# Altium footprint library Audio-Beamformer.PcbLib: 47 footprints (part 1 of 3)
Each footprint in its own frame and in the unit in brackets; x right, y up, seen from the top. Pads: shape width x height; smd on the part's side, far side on the other; paste and mask are expansions set on the pad; w line width, h text height; cw(c..) or ccw(c..) is an arc to the next point about the centre after c.
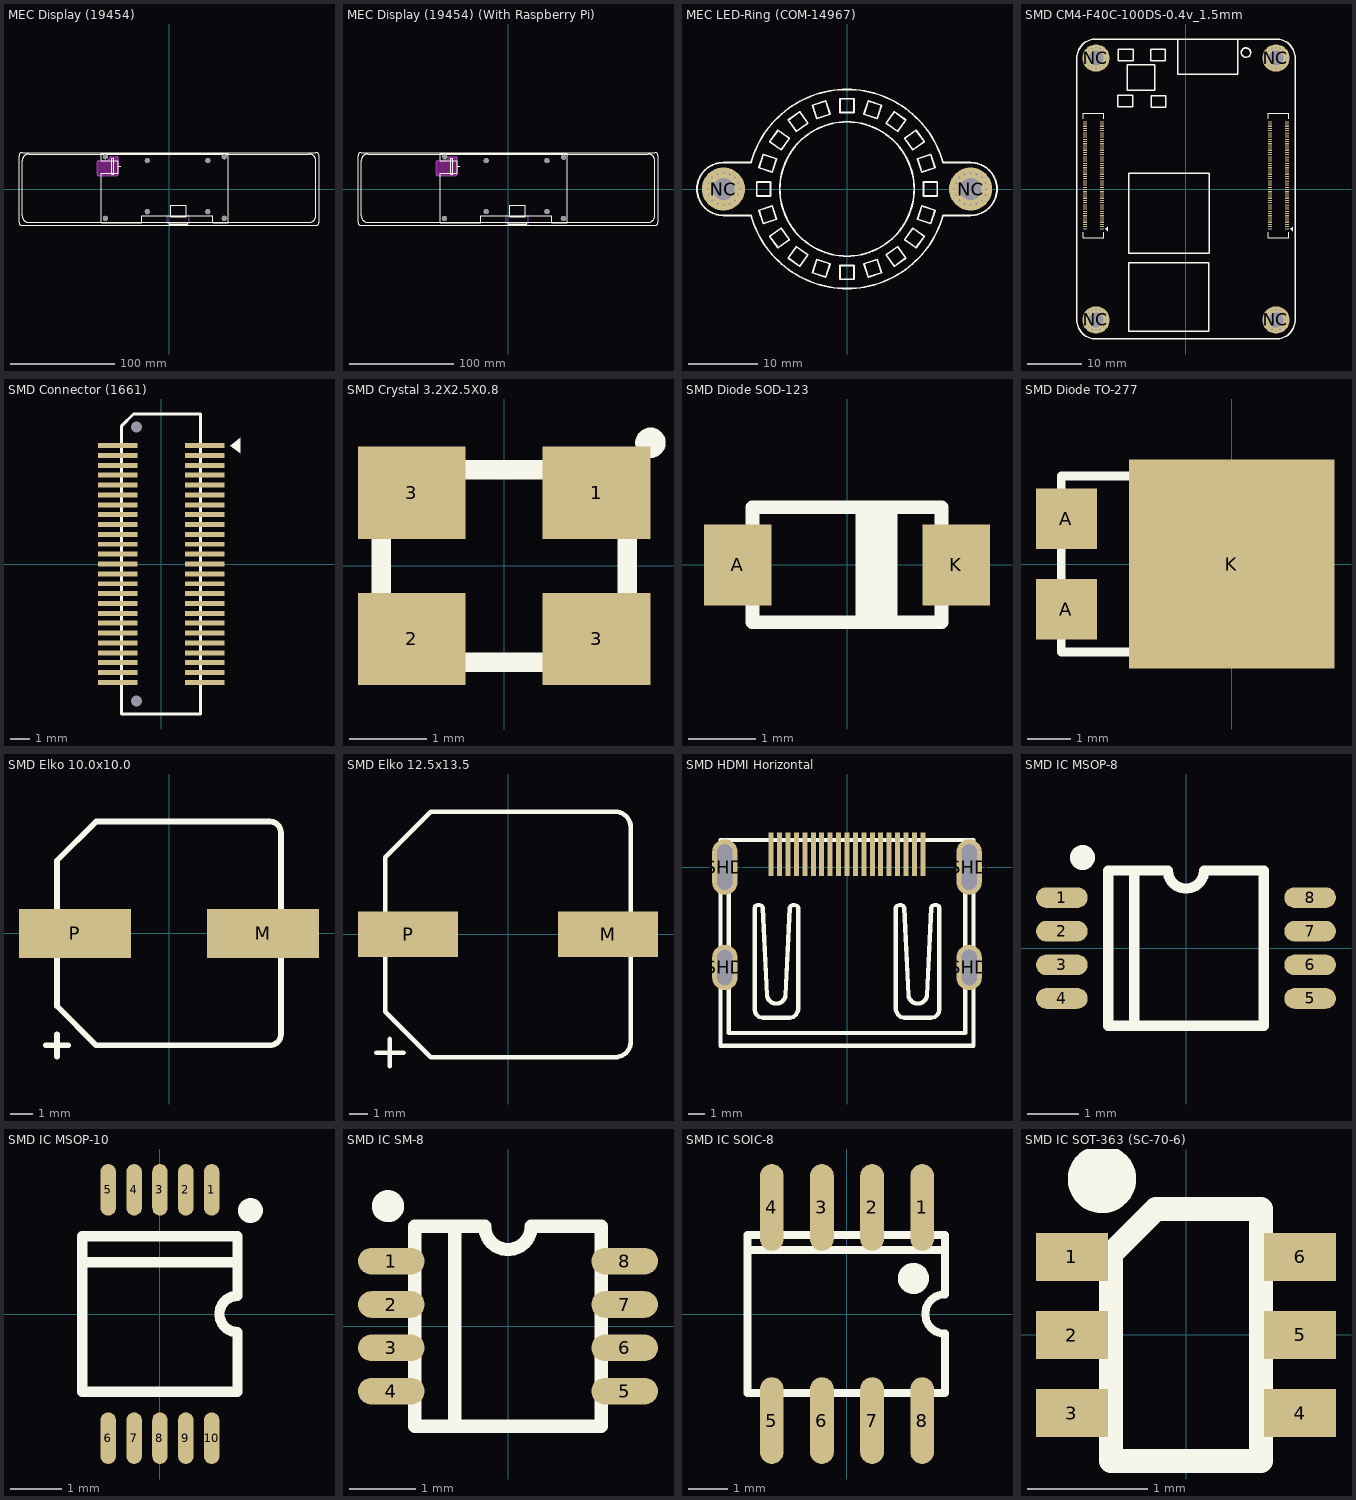
[diagram p0: the footprints below, top view; thin cyan lines are the x and y axes]

## MEC Display (19454) [mm] "Capacitor, Electrolytic, Radial; Body 5 x 5 mm (Dia.xH typ); Pin Spacing 2 mm (typ)"
height 6
pads (8):
  round 5 hole 2.7: NC(-61,-28.1) NC(-61,30.9) NC(-20.8,-21.725) NC(-20.8,27.275) NC(37.2,-21.725) NC(37.2,27.275) NC(53,-28.1) NC(53,30.9)
via 54.344,29.556 diameter 0.62 hole 0.3
via 53,29 diameter 0.62 hole 0.3
via 53.727,29.145 diameter 0.62 hole 0.3
via 54.755,30.173 diameter 0.62 hole 0.3
via 54.344,32.243 diameter 0.62 hole 0.3
via 54.9,30.9 diameter 0.62 hole 0.3
via 54.755,31.627 diameter 0.62 hole 0.3
via 53.727,32.655 diameter 0.62 hole 0.3
via 51.657,29.556 diameter 0.62 hole 0.3
via 51.1,30.9 diameter 0.62 hole 0.3
via 51.245,30.173 diameter 0.62 hole 0.3
via 52.273,29.145 diameter 0.62 hole 0.3
via 51.245,31.627 diameter 0.62 hole 0.3
via 52.273,32.655 diameter 0.62 hole 0.3
via 53,32.8 diameter 0.62 hole 0.3
via 51.656,32.243 diameter 0.62 hole 0.3
via -59.656,29.556 diameter 0.62 hole 0.3
via -61,29 diameter 0.62 hole 0.3
via -60.273,29.145 diameter 0.62 hole 0.3
via -59.245,30.173 diameter 0.62 hole 0.3
via -59.656,32.243 diameter 0.62 hole 0.3
via -59.1,30.9 diameter 0.62 hole 0.3
via -59.245,31.627 diameter 0.62 hole 0.3
via -60.273,32.655 diameter 0.62 hole 0.3
via -62.343,29.556 diameter 0.62 hole 0.3
via -62.9,30.9 diameter 0.62 hole 0.3
via -62.755,30.173 diameter 0.62 hole 0.3
via -61.727,29.145 diameter 0.62 hole 0.3
via -62.755,31.627 diameter 0.62 hole 0.3
via -61.727,32.655 diameter 0.62 hole 0.3
via -61,32.8 diameter 0.62 hole 0.3
via -62.344,32.243 diameter 0.62 hole 0.3
via 54.344,-29.444 diameter 0.62 hole 0.3
via 53,-30 diameter 0.62 hole 0.3
via 53.727,-29.855 diameter 0.62 hole 0.3
via 54.755,-28.827 diameter 0.62 hole 0.3
via 54.344,-26.757 diameter 0.62 hole 0.3
via 54.9,-28.1 diameter 0.62 hole 0.3
via 54.755,-27.373 diameter 0.62 hole 0.3
via 53.727,-26.345 diameter 0.62 hole 0.3
via 51.657,-29.444 diameter 0.62 hole 0.3
via 51.1,-28.1 diameter 0.62 hole 0.3
via 51.245,-28.827 diameter 0.62 hole 0.3
via 52.273,-29.855 diameter 0.62 hole 0.3
via 51.245,-27.373 diameter 0.62 hole 0.3
via 52.273,-26.345 diameter 0.62 hole 0.3
via 53,-26.2 diameter 0.62 hole 0.3
via 51.656,-26.757 diameter 0.62 hole 0.3
via -59.656,-29.444 diameter 0.62 hole 0.3
via -61,-30 diameter 0.62 hole 0.3
via -60.273,-29.855 diameter 0.62 hole 0.3
via -59.245,-28.827 diameter 0.62 hole 0.3
via -59.656,-26.757 diameter 0.62 hole 0.3
via -59.1,-28.1 diameter 0.62 hole 0.3
via -59.245,-27.373 diameter 0.62 hole 0.3
via -60.273,-26.345 diameter 0.62 hole 0.3
via -62.343,-29.444 diameter 0.62 hole 0.3
via -62.9,-28.1 diameter 0.62 hole 0.3
via -62.755,-28.827 diameter 0.62 hole 0.3
via -61.727,-29.855 diameter 0.62 hole 0.3
via -62.755,-27.373 diameter 0.62 hole 0.3
via -61.727,-26.345 diameter 0.62 hole 0.3
via -61,-26.2 diameter 0.62 hole 0.3
via -62.344,-26.757 diameter 0.62 hole 0.3
via -19.456,25.931 diameter 0.62 hole 0.3
via -20.8,25.375 diameter 0.62 hole 0.3
via -20.073,25.52 diameter 0.62 hole 0.3
via -19.045,26.548 diameter 0.62 hole 0.3
via -19.456,28.618 diameter 0.62 hole 0.3
via -18.9,27.275 diameter 0.62 hole 0.3
via -19.045,28.002 diameter 0.62 hole 0.3
via -20.073,29.03 diameter 0.62 hole 0.3
via -22.143,25.931 diameter 0.62 hole 0.3
via -22.7,27.275 diameter 0.62 hole 0.3
via -22.555,26.548 diameter 0.62 hole 0.3
via -21.527,25.52 diameter 0.62 hole 0.3
via -22.555,28.002 diameter 0.62 hole 0.3
via -21.527,29.03 diameter 0.62 hole 0.3
via -20.8,29.175 diameter 0.62 hole 0.3
via -22.144,28.619 diameter 0.62 hole 0.3
via 38.544,25.931 diameter 0.62 hole 0.3
via 37.2,25.375 diameter 0.62 hole 0.3
via 37.927,25.52 diameter 0.62 hole 0.3
via 38.955,26.548 diameter 0.62 hole 0.3
via 38.543,28.618 diameter 0.62 hole 0.3
via 39.1,27.275 diameter 0.62 hole 0.3
via 38.955,28.002 diameter 0.62 hole 0.3
via 37.927,29.03 diameter 0.62 hole 0.3
via 35.856,25.931 diameter 0.62 hole 0.3
via 35.3,27.275 diameter 0.62 hole 0.3
via 35.445,26.548 diameter 0.62 hole 0.3
via 36.473,25.52 diameter 0.62 hole 0.3
via 35.445,28.002 diameter 0.62 hole 0.3
via 36.473,29.03 diameter 0.62 hole 0.3
via 37.2,29.175 diameter 0.62 hole 0.3
via 35.856,28.619 diameter 0.62 hole 0.3
via 38.544,-23.069 diameter 0.62 hole 0.3
via 37.2,-23.625 diameter 0.62 hole 0.3
via 37.927,-23.48 diameter 0.62 hole 0.3
via 38.955,-22.452 diameter 0.62 hole 0.3
via 38.543,-20.382 diameter 0.62 hole 0.3
via 39.1,-21.725 diameter 0.62 hole 0.3
via 38.955,-20.998 diameter 0.62 hole 0.3
via 37.927,-19.97 diameter 0.62 hole 0.3
via 35.856,-23.069 diameter 0.62 hole 0.3
via 35.3,-21.725 diameter 0.62 hole 0.3
via 35.445,-22.452 diameter 0.62 hole 0.3
via 36.473,-23.48 diameter 0.62 hole 0.3
via 35.445,-20.998 diameter 0.62 hole 0.3
via 36.473,-19.97 diameter 0.62 hole 0.3
via 37.2,-19.825 diameter 0.62 hole 0.3
via 35.856,-20.382 diameter 0.62 hole 0.3
via -19.456,-23.069 diameter 0.62 hole 0.3
via -20.8,-23.625 diameter 0.62 hole 0.3
via -20.073,-23.48 diameter 0.62 hole 0.3
via -19.045,-22.452 diameter 0.62 hole 0.3
via -19.456,-20.382 diameter 0.62 hole 0.3
via -18.9,-21.725 diameter 0.62 hole 0.3
via -19.045,-20.998 diameter 0.62 hole 0.3
via -20.073,-19.97 diameter 0.62 hole 0.3
via -22.143,-23.069 diameter 0.62 hole 0.3
via -22.7,-21.725 diameter 0.62 hole 0.3
via -22.555,-22.452 diameter 0.62 hole 0.3
via -21.527,-23.48 diameter 0.62 hole 0.3
via -22.555,-20.998 diameter 0.62 hole 0.3
via -21.527,-19.97 diameter 0.62 hole 0.3
via -20.8,-19.825 diameter 0.62 hole 0.3
via -22.144,-20.382 diameter 0.62 hole 0.3
Top Overlay:
  circle w0.254: c53,30.9 r1.35
  circle w0.254: c-61,30.9 r1.35
  circle w0.254: c53,-28.1 r1.35
  circle w0.254: c-61,-28.1 r1.35
  circle w0.254: c37.2,-21.725 r1.35
  circle w0.254: c37.2,27.275 r1.35
  circle w0.254: c-20.8,27.275 r1.35
  circle w0.254: c-20.8,-21.725 r1.35
  lines w0.254: -48.8,21.85 -46.35,21.85 ; -143.75,-31.9 ccw(c-140.75,-31.9) -140.75,-34.9 140.75,-34.9 ccw(c140.75,-31.9) 143.75,-31.9 143.75,31.9 ccw(c140.75,31.9) 140.75,34.9 -140.75,34.9 ccw(c-140.75,31.9) -143.75,31.9 -143.75,-31.9 ; -140.6,-25.8 ccw(c-134.4,-25.8) -134.4,-32 134.4,-32 ccw(c134.4,-25.8) 140.6,-25.8 140.6,27.3 ccw(c134.4,27.3) 134.4,33.5 -134.4,33.5 ccw(c-134.4,27.3) -140.6,27.3 -140.6,-25.8 ; -65,-32.5 -26,-32.5 -26,-25.5 41.7,-25.5 41.7,-32.5 57,-32.5 57,34 -65,34 -65,27.1 -48.8,27.1 -48.8,14.9 -65,14.9 -65,-32.5 ; -54.7,14.35 -54.7,29.35 -53.1,29.35 -53.1,14.35 -54.7,14.35 ; 0,-33.9 0,-32.3 18,-32.3 18,-33.9 0,-33.9 ; 1.5,-26.6 1.5,-15.66 16.5,-15.66 16.5,-26.6 1.5,-26.6
Keep-Out Layer:
  board cut-out: -49.8,30.8 -49.702,30.8 -49.508,30.762 -49.326,30.686 -49.163,30.577 -49.023,30.437 -48.914,30.274 -48.838,30.092 -48.8,29.898 -48.8,29.8 -48.8,13.9 -48.8,13.802 -48.838,13.608 -48.914,13.426 -49.023,13.263 -49.163,13.123 -49.326,13.014 -49.508,12.938 -49.702,12.9 -49.8,12.9 -67.8,12.9 -67.898,12.9 -68.092,12.938 -68.274,13.014 -68.437,13.123 -68.577,13.263 -68.686,13.426 -68.762,13.608 -68.8,13.802 -68.8,13.9 -68.8,26.1 -68.8,26.198 -68.762,26.392 -68.686,26.574 -68.577,26.737 -68.437,26.877 -68.274,26.986 -68.092,27.062 -67.898,27.1 -67.8,27.1 -60.56,27.1 -60.384,27.104 -60.034,27.139 -59.689,27.207 -59.352,27.31 -59.027,27.444 -58.717,27.61 -58.424,27.805 -58.152,28.029 -58.025,28.15 -57.725,28.475 -57.525,28.75 -57.35,29.025 -57.225,29.275 -57.125,29.525 -57.05,29.725 -56.975,29.975 -56.9,30.225 -56.825,30.375 -56.725,30.5 -56.575,30.625 -56.5,30.675 -56.4,30.725 -56.275,30.775 -56.075,30.8 -49.825,30.8
Mechanical 1:
  lines w0.254: -1.5,-34 -1.5,-26.5 cw(c-0.5,-26.5) -0.5,-25.5 9,-25.5 18.5,-25.5 cw(c18.5,-26.5) 19.5,-26.5 19.5,-34 ; -68.8,13.9 ccw(c-67.8,13.9) -67.8,12.9 -49.8,12.9 ccw(c-49.8,13.9) -48.8,13.9 -48.8,21 -48.8,29.8 ccw(c-49.8,29.8) -49.8,30.8 -56.025,30.8 ccw(c-56.025,29.838) -56.946,30.116 -57.026,29.842 cw(c-60.6,30.8) -60.6,27.1 -67.8,27.1 ccw(c-67.8,26.1) -68.8,26.1 -68.8,21 -68.8,13.9
3D body "Adapter_HDMI.x_t": height 7.8, standoff -8.2, extent 0,-36.8 18,-19.8
3D body "Display (No Connectors).x_t": height 16.9, standoff 0, extent -143.75,-34.9 143.75,34.9
3D body "Adapter_USB.x_t": height 8.35, standoff -7.95, extent -55.1,14.35 -38.1,29.35

## MEC Display (19454) (With Raspberry Pi) [mm] "Capacitor, Electrolytic, Radial; Body 5 x 5 mm (Dia.xH typ); Pin Spacing 2 mm (typ)"
height 6
pads (8):
  round 5 hole 2.7: NC(-61,-28.2) NC(-60.6,30.8) NC(-20.9,-21.65) NC(-20.9,27.2) NC(37.3,-21.65) NC(37.3,27.2) NC(53,-28.2) NC(53.3,30.4)
via -59.256,29.456 diameter 0.62 hole 0.3
via -60.6,28.9 diameter 0.62 hole 0.3
via -59.873,29.045 diameter 0.62 hole 0.3
via -58.845,30.073 diameter 0.62 hole 0.3
via -59.257,32.143 diameter 0.62 hole 0.3
via -58.7,30.8 diameter 0.62 hole 0.3
via -58.845,31.527 diameter 0.62 hole 0.3
via -59.873,32.555 diameter 0.62 hole 0.3
via -61.944,29.456 diameter 0.62 hole 0.3
via -62.5,30.8 diameter 0.62 hole 0.3
via -62.355,30.073 diameter 0.62 hole 0.3
via -61.327,29.045 diameter 0.62 hole 0.3
via -62.355,31.527 diameter 0.62 hole 0.3
via -61.327,32.555 diameter 0.62 hole 0.3
via -60.6,32.7 diameter 0.62 hole 0.3
via -61.944,32.143 diameter 0.62 hole 0.3
via -19.556,25.856 diameter 0.62 hole 0.3
via -20.9,25.3 diameter 0.62 hole 0.3
via -20.173,25.445 diameter 0.62 hole 0.3
via -19.145,26.473 diameter 0.62 hole 0.3
via -19.556,28.543 diameter 0.62 hole 0.3
via -19,27.2 diameter 0.62 hole 0.3
via -19.145,27.927 diameter 0.62 hole 0.3
via -20.173,28.955 diameter 0.62 hole 0.3
via -22.243,25.856 diameter 0.62 hole 0.3
via -22.8,27.2 diameter 0.62 hole 0.3
via -22.655,26.473 diameter 0.62 hole 0.3
via -21.627,25.445 diameter 0.62 hole 0.3
via -22.655,27.927 diameter 0.62 hole 0.3
via -21.627,28.955 diameter 0.62 hole 0.3
via -20.9,29.1 diameter 0.62 hole 0.3
via -22.244,28.543 diameter 0.62 hole 0.3
via 38.644,25.856 diameter 0.62 hole 0.3
via 37.3,25.3 diameter 0.62 hole 0.3
via 38.027,25.445 diameter 0.62 hole 0.3
via 39.055,26.473 diameter 0.62 hole 0.3
via 38.643,28.543 diameter 0.62 hole 0.3
via 39.2,27.2 diameter 0.62 hole 0.3
via 39.055,27.927 diameter 0.62 hole 0.3
via 38.027,28.955 diameter 0.62 hole 0.3
via 35.956,25.856 diameter 0.62 hole 0.3
via 35.4,27.2 diameter 0.62 hole 0.3
via 35.545,26.473 diameter 0.62 hole 0.3
via 36.573,25.445 diameter 0.62 hole 0.3
via 35.545,27.927 diameter 0.62 hole 0.3
via 36.573,28.955 diameter 0.62 hole 0.3
via 37.3,29.1 diameter 0.62 hole 0.3
via 35.956,28.543 diameter 0.62 hole 0.3
via 54.644,29.056 diameter 0.62 hole 0.3
via 53.3,28.5 diameter 0.62 hole 0.3
via 54.027,28.645 diameter 0.62 hole 0.3
via 55.055,29.673 diameter 0.62 hole 0.3
via 54.644,31.743 diameter 0.62 hole 0.3
via 55.2,30.4 diameter 0.62 hole 0.3
via 55.055,31.127 diameter 0.62 hole 0.3
via 54.027,32.155 diameter 0.62 hole 0.3
via 51.957,29.056 diameter 0.62 hole 0.3
via 51.4,30.4 diameter 0.62 hole 0.3
via 51.545,29.673 diameter 0.62 hole 0.3
via 52.573,28.645 diameter 0.62 hole 0.3
via 51.545,31.127 diameter 0.62 hole 0.3
via 52.573,32.155 diameter 0.62 hole 0.3
via 53.3,32.3 diameter 0.62 hole 0.3
via 51.956,31.744 diameter 0.62 hole 0.3
via 54.344,-29.544 diameter 0.62 hole 0.3
via 53,-30.1 diameter 0.62 hole 0.3
via 53.727,-29.955 diameter 0.62 hole 0.3
via 54.755,-28.927 diameter 0.62 hole 0.3
via 54.344,-26.857 diameter 0.62 hole 0.3
via 54.9,-28.2 diameter 0.62 hole 0.3
via 54.755,-27.473 diameter 0.62 hole 0.3
via 53.727,-26.445 diameter 0.62 hole 0.3
via 51.657,-29.544 diameter 0.62 hole 0.3
via 51.1,-28.2 diameter 0.62 hole 0.3
via 51.245,-28.927 diameter 0.62 hole 0.3
via 52.273,-29.955 diameter 0.62 hole 0.3
via 51.245,-27.473 diameter 0.62 hole 0.3
via 52.273,-26.445 diameter 0.62 hole 0.3
via 53,-26.3 diameter 0.62 hole 0.3
via 51.656,-26.856 diameter 0.62 hole 0.3
via 38.644,-22.994 diameter 0.62 hole 0.3
via 37.3,-23.55 diameter 0.62 hole 0.3
via 38.027,-23.405 diameter 0.62 hole 0.3
via 39.055,-22.377 diameter 0.62 hole 0.3
via 38.643,-20.307 diameter 0.62 hole 0.3
via 39.2,-21.65 diameter 0.62 hole 0.3
via 39.055,-20.923 diameter 0.62 hole 0.3
via 38.027,-19.895 diameter 0.62 hole 0.3
via 35.956,-22.994 diameter 0.62 hole 0.3
via 35.4,-21.65 diameter 0.62 hole 0.3
via 35.545,-22.377 diameter 0.62 hole 0.3
via 36.573,-23.405 diameter 0.62 hole 0.3
via 35.545,-20.923 diameter 0.62 hole 0.3
via 36.573,-19.895 diameter 0.62 hole 0.3
via 37.3,-19.75 diameter 0.62 hole 0.3
via 35.956,-20.306 diameter 0.62 hole 0.3
via -19.556,-22.994 diameter 0.62 hole 0.3
via -20.9,-23.55 diameter 0.62 hole 0.3
via -20.173,-23.405 diameter 0.62 hole 0.3
via -19.145,-22.377 diameter 0.62 hole 0.3
via -19.556,-20.307 diameter 0.62 hole 0.3
via -19,-21.65 diameter 0.62 hole 0.3
via -19.145,-20.923 diameter 0.62 hole 0.3
via -20.173,-19.895 diameter 0.62 hole 0.3
via -22.243,-22.994 diameter 0.62 hole 0.3
via -22.8,-21.65 diameter 0.62 hole 0.3
via -22.655,-22.377 diameter 0.62 hole 0.3
via -21.627,-23.405 diameter 0.62 hole 0.3
via -22.655,-20.923 diameter 0.62 hole 0.3
via -21.627,-19.895 diameter 0.62 hole 0.3
via -20.9,-19.75 diameter 0.62 hole 0.3
via -22.244,-20.306 diameter 0.62 hole 0.3
via -59.656,-29.544 diameter 0.62 hole 0.3
via -61,-30.1 diameter 0.62 hole 0.3
via -60.273,-29.955 diameter 0.62 hole 0.3
via -59.245,-28.927 diameter 0.62 hole 0.3
via -59.656,-26.857 diameter 0.62 hole 0.3
via -59.1,-28.2 diameter 0.62 hole 0.3
via -59.245,-27.473 diameter 0.62 hole 0.3
via -60.273,-26.445 diameter 0.62 hole 0.3
via -62.343,-29.544 diameter 0.62 hole 0.3
via -62.9,-28.2 diameter 0.62 hole 0.3
via -62.755,-28.927 diameter 0.62 hole 0.3
via -61.727,-29.955 diameter 0.62 hole 0.3
via -62.755,-27.473 diameter 0.62 hole 0.3
via -61.727,-26.445 diameter 0.62 hole 0.3
via -61,-26.3 diameter 0.62 hole 0.3
via -62.344,-26.856 diameter 0.62 hole 0.3
Top Overlay:
  circle w0.254: c53,-28.2 r1.35
  circle w0.254: c37.3,-21.65 r1.35
  circle w0.254: c53.3,30.4 r1.35
  circle w0.254: c37.3,27.2 r1.35
  circle w0.254: c-20.9,27.2 r1.35
  circle w0.254: c-60.6,30.8 r1.35
  circle w0.254: c-20.9,-21.65 r1.35
  circle w0.254: c-61,-28.2 r1.35
  lines w0.254: -48.8,21.85 -46.35,21.85 ; -143.75,-31.9 ccw(c-140.75,-31.9) -140.75,-34.9 140.75,-34.9 ccw(c140.75,-31.9) 143.75,-31.9 143.75,31.9 ccw(c140.75,31.9) 140.75,34.9 -140.75,34.9 ccw(c-140.75,31.9) -143.75,31.9 -143.75,-31.9 ; -140.6,-25.8 ccw(c-134.4,-25.8) -134.4,-32 134.4,-32 ccw(c134.4,-25.8) 140.6,-25.8 140.6,27.3 ccw(c134.4,27.3) 134.4,33.5 -134.4,33.5 ccw(c-134.4,27.3) -140.6,27.3 -140.6,-25.8 ; -65,-32.5 -26,-32.5 -26,-25.5 41.7,-25.5 41.7,-32.5 57,-32.5 57,34 -65,34 -65,27.1 -48.8,27.1 -48.8,14.9 -65,14.9 -65,-32.5 ; -54.7,14.35 -54.7,29.35 -53.1,29.35 -53.1,14.35 -54.7,14.35 ; 0,-33.9 0,-32.3 18,-32.3 18,-33.9 0,-33.9 ; 1.5,-26.6 1.5,-15.66 16.5,-15.66 16.5,-26.6 1.5,-26.6
Keep-Out Layer:
  board cut-out: -49.8,30.8 -49.702,30.8 -49.508,30.762 -49.326,30.686 -49.163,30.577 -49.023,30.437 -48.914,30.274 -48.838,30.092 -48.8,29.898 -48.8,29.8 -48.8,13.9 -48.8,13.802 -48.838,13.608 -48.914,13.426 -49.023,13.263 -49.163,13.123 -49.326,13.014 -49.508,12.938 -49.702,12.9 -49.8,12.9 -67.8,12.9 -67.898,12.9 -68.092,12.938 -68.274,13.014 -68.437,13.123 -68.577,13.263 -68.686,13.426 -68.762,13.608 -68.8,13.802 -68.8,13.9 -68.8,26.1 -68.8,26.198 -68.762,26.392 -68.686,26.574 -68.577,26.737 -68.437,26.877 -68.274,26.986 -68.092,27.062 -67.898,27.1 -67.8,27.1 -60.56,27.1 -60.384,27.104 -60.034,27.139 -59.689,27.207 -59.352,27.31 -59.027,27.444 -58.717,27.61 -58.424,27.805 -58.152,28.029 -58.025,28.15 -57.725,28.475 -57.525,28.75 -57.35,29.025 -57.225,29.275 -57.125,29.525 -57.05,29.725 -56.975,29.975 -56.9,30.225 -56.825,30.375 -56.725,30.5 -56.575,30.625 -56.5,30.675 -56.4,30.725 -56.275,30.775 -56.075,30.8 -49.825,30.8
Mechanical 1:
  lines w0.254: -1.5,-34.9 -1.5,-25.5 9,-25.5 19.5,-25.5 19.5,-34.9 ; -68.8,13.9 ccw(c-67.8,13.9) -67.8,12.9 -49.8,12.9 ccw(c-49.8,13.9) -48.8,13.9 -48.8,21 -48.8,29.8 ccw(c-49.8,29.8) -49.8,30.8 -56.025,30.8 ccw(c-56.025,29.838) -56.946,30.116 -57.026,29.842 cw(c-60.6,30.8) -60.6,27.1 -67.8,27.1 ccw(c-67.8,26.1) -68.8,26.1 -68.8,21 -68.8,13.9
3D body "Adapter_HDMI.x_t": height 7.8, standoff -8.2, extent 0,-36.8 18,-19.8
3D body "raspberry_pi_3_b_plus.stp": height 2.12, standoff -17.9, extent -46.671,-27.658 40.6,30.8
3D body "Display (No Connectors).x_t": height 16.9, standoff 0, extent -143.75,-34.9 143.75,34.9
3D body "Adapter_USB.x_t": height 8.35, standoff -7.95, extent -55.1,14.35 -38.1,29.35
3D body "c-292303-1-e4-3d.x_t": height 8.84, standoff -2.52, extent -46.35,13.733 -32.35,29.967

## MEC LED-Ring (COM-14967) [mm] "Capacitor, Electrolytic, Radial; Body 5 x 5 mm (Dia.xH typ); Pin Spacing 2 mm (typ)"
height 6
pads (2):
  round 6.2 hole 3.2: NC(-17.78,0) NC(17.78,0)
via 19.406,1.626 diameter 0.62 hole 0.3
via 19.905,0.88 diameter 0.62 hole 0.3
via 18.66,2.125 diameter 0.62 hole 0.3
via 20.08,0 diameter 0.62 hole 0.3
via 17.78,2.3 diameter 0.62 hole 0.3
via 15.48,0 diameter 0.62 hole 0.3
via 16.154,1.626 diameter 0.62 hole 0.3
via 16.154,-1.626 diameter 0.62 hole 0.3
via 19.406,-1.626 diameter 0.62 hole 0.3
via 15.655,-0.88 diameter 0.62 hole 0.3
via 18.66,-2.125 diameter 0.62 hole 0.3
via 16.9,2.125 diameter 0.62 hole 0.3
via 16.9,-2.125 diameter 0.62 hole 0.3
via 15.655,0.88 diameter 0.62 hole 0.3
via 17.78,-2.3 diameter 0.62 hole 0.3
via 19.905,-0.88 diameter 0.62 hole 0.3
via -19.406,1.626 diameter 0.62 hole 0.3
via -19.905,0.88 diameter 0.62 hole 0.3
via -18.66,2.125 diameter 0.62 hole 0.3
via -20.08,0 diameter 0.62 hole 0.3
via -17.78,2.3 diameter 0.62 hole 0.3
via -15.48,0 diameter 0.62 hole 0.3
via -16.154,1.626 diameter 0.62 hole 0.3
via -16.154,-1.626 diameter 0.62 hole 0.3
via -19.406,-1.626 diameter 0.62 hole 0.3
via -15.655,-0.88 diameter 0.62 hole 0.3
via -18.66,-2.125 diameter 0.62 hole 0.3
via -16.9,2.125 diameter 0.62 hole 0.3
via -16.9,-2.125 diameter 0.62 hole 0.3
via -15.655,0.88 diameter 0.62 hole 0.3
via -17.78,-2.3 diameter 0.62 hole 0.3
via -19.905,-0.88 diameter 0.62 hole 0.3
Top Overlay:
  circle w0.254: c0,0 r9.66
  lines w0.254: -21.58,0 cw(c-17.78,0) -17.78,3.8 -13.807,3.8 cw(c0,0) 0,14.32 cw(c0,0) 13.807,3.799 17.78,3.8 cw(c17.78,0) 21.58,0 cw(c17.78,0) 17.78,-3.8 13.807,-3.8 cw(c0,0) 0,-14.32 cw(c0,0) -13.807,-3.799 -17.78,-3.8 cw(c-17.78,0) -21.58,0 ; -12.998,-1 -12.998,1 -10.997,1 -10.997,-1 -12.998,-1 ; -12.67,-3.065 -12.052,-4.968 -10.15,-4.349 -10.768,-2.447 -12.67,-3.065 ; -12.67,3.065 -12.052,4.968 -10.15,4.349 -10.768,2.447 -12.67,3.065 ; -11.103,-6.831 -9.927,-8.449 -8.309,-7.273 -9.485,-5.655 -11.103,-6.831 ; -11.103,6.831 -9.927,8.449 -8.309,7.273 -9.485,5.655 -11.103,6.831 ; -8.449,-9.927 -6.831,-11.103 -5.655,-9.485 -7.273,-8.309 -8.449,-9.927 ; -8.449,9.927 -6.831,11.103 -5.655,9.485 -7.273,8.309 -8.449,9.927 ; -4.968,-12.052 -3.065,-12.67 -2.447,-10.768 -4.349,-10.15 -4.968,-12.052 ; -4.968,12.052 -3.065,12.67 -2.447,10.768 -4.349,10.15 -4.968,12.052 ; -1,-12.998 1,-12.998 1,-10.997 -1,-10.997 -1,-12.998 ; -1,10.997 -1,12.998 1,12.998 1,10.997 -1,10.997 ; 2.447,-10.768 4.349,-10.15 4.968,-12.052 3.065,-12.67 2.447,-10.768 ; 2.447,10.768 3.065,12.67 4.968,12.052 4.349,10.15 2.447,10.768 ; 5.655,-9.485 7.273,-8.309 8.449,-9.927 6.831,-11.103 5.655,-9.485 ; 5.655,9.485 6.831,11.103 8.449,9.927 7.273,8.309 5.655,9.485 ; 8.309,-7.273 9.485,-5.655 11.103,-6.831 9.927,-8.449 8.309,-7.273 ; 8.309,7.273 9.927,8.449 11.103,6.831 9.485,5.655 8.309,7.273 ; 10.15,-4.349 10.768,-2.447 12.67,-3.065 12.052,-4.968 10.15,-4.349 ; 10.15,4.349 12.052,4.968 12.67,3.065 10.768,2.447 10.15,4.349 ; 10.997,-1 10.997,1 12.998,1 12.998,-1 10.997,-1
3D body "LED-Ring.x_t": height 12.91, standoff 11, extent -21.626,-14.358 21.554,14.358

## SMD CM4-F40C-100DS-0.4v_1.5mm [mm] "DF40C-100DS-0.4v by Amornthep Phunsin"
pads (204):
  rect 0.7x0.2 smd: 1(18.5,-7.3) 2(15.42,-7.3) 3(18.5,-6.9) 4(15.42,-6.9) 5(18.5,-6.5) 6(15.42,-6.5) 7(18.5,-6.1) 8(15.42,-6.1) 9(18.5,-5.7) 10(15.42,-5.7) 11(18.5,-5.3) 12(15.42,-5.3) 13(18.5,-4.9) 14(15.42,-4.9) 15(18.5,-4.5) 16(15.42,-4.5) 17(18.5,-4.1) 18(15.42,-4.1) 19(18.5,-3.7) 20(15.42,-3.7) 21(18.5,-3.3) 22(15.42,-3.3) 23(18.5,-2.9) 24(15.42,-2.9) 25(18.5,-2.5) 26(15.42,-2.5) 27(18.5,-2.1) 28(15.42,-2.1) 29(18.5,-1.7) 30(15.42,-1.7) 31(18.5,-1.3) 32(15.42,-1.3) 33(18.5,-0.9) 34(15.42,-0.9) 35(18.5,-0.5) 36(15.42,-0.5) 37(18.5,-0.1) 38(15.42,-0.1) 39(18.5,0.3) 40(15.42,0.3) 41(18.5,0.7) 42(15.42,0.7) 43(18.5,1.1) 44(15.42,1.1) 45(18.5,1.5) 46(15.42,1.5) 47(18.5,1.9) 48(15.42,1.9) 49(18.5,2.3) 50(15.42,2.3) 51(18.5,2.7) 52(15.42,2.7) 53(18.5,3.1) 54(15.42,3.1) 55(18.5,3.5) 56(15.42,3.5) 57(18.5,3.9) 58(15.42,3.9) 59(18.5,4.3) 60(15.42,4.3) 61(18.5,4.7) 62(15.42,4.7) 63(18.5,5.1) 64(15.42,5.1) 65(18.5,5.5) 66(15.42,5.5) 67(18.5,5.9) 68(15.42,5.9) 69(18.5,6.3) 70(15.42,6.3) 71(18.5,6.7) 72(15.42,6.7) 73(18.5,7.1) 74(15.42,7.1) 75(18.5,7.5) 76(15.42,7.5) 77(18.5,7.9) 78(15.42,7.9) 79(18.5,8.3) 80(15.42,8.3) 81(18.5,8.7) 82(15.42,8.7) 83(18.5,9.1) 84(15.42,9.1) 85(18.5,9.5) 86(15.42,9.5) 87(18.5,9.9) 88(15.42,9.9) 89(18.5,10.3) 90(15.42,10.3) 91(18.5,10.7) 92(15.42,10.7) 93(18.5,11.1) 94(15.42,11.1) 95(18.5,11.5) 96(15.42,11.5) 97(18.5,11.9) 98(15.42,11.9) 99(18.5,12.3) 100(15.42,12.3) 101(-15.42,-7.3) 102(-18.5,-7.3) 103(-15.42,-6.9) 104(-18.5,-6.9) 105(-15.42,-6.5) 106(-18.5,-6.5) 107(-15.42,-6.1) 108(-18.5,-6.1) 109(-15.42,-5.7) 110(-18.5,-5.7) 111(-15.42,-5.3) 112(-18.5,-5.3) 113(-15.42,-4.9) 114(-18.5,-4.9) 115(-15.42,-4.5) 116(-18.5,-4.5) 117(-15.42,-4.1) 118(-18.5,-4.1) 119(-15.42,-3.7) 120(-18.5,-3.7) 121(-15.42,-3.3) 122(-18.5,-3.3) 123(-15.42,-2.9) 124(-18.5,-2.9) 125(-15.42,-2.5) 126(-18.5,-2.5) 127(-15.42,-2.1) 128(-18.5,-2.1) 129(-15.42,-1.7) 130(-18.5,-1.7) 131(-15.42,-1.3) 132(-18.5,-1.3) 133(-15.42,-0.9) 134(-18.5,-0.9) 135(-15.42,-0.5) 136(-18.5,-0.5) 137(-15.42,-0.1) 138(-18.5,-0.1) 139(-15.42,0.3) 140(-18.5,0.3) 141(-15.42,0.7) 142(-18.5,0.7) 143(-15.42,1.1) 144(-18.5,1.1) 145(-15.42,1.5) 146(-18.5,1.5) 147(-15.42,1.9) 148(-18.5,1.9) 149(-15.42,2.3) 150(-18.5,2.3) 151(-15.42,2.7) 152(-18.5,2.7) 153(-15.42,3.1) 154(-18.5,3.1) 155(-15.42,3.5) 156(-18.5,3.5) 157(-15.42,3.9) 158(-18.5,3.9) 159(-15.42,4.3) 160(-18.5,4.3) 161(-15.42,4.7) 162(-18.5,4.7) 163(-15.42,5.1) 164(-18.5,5.1) 165(-15.42,5.5) 166(-18.5,5.5) 167(-15.42,5.9) 168(-18.5,5.9) 169(-15.42,6.3) 170(-18.5,6.3) 171(-15.42,6.7) 172(-18.5,6.7) 173(-15.42,7.1) 174(-18.5,7.1) 175(-15.42,7.5) 176(-18.5,7.5) 177(-15.42,7.9) 178(-18.5,7.9) 179(-15.42,8.3) 180(-18.5,8.3) 181(-15.42,8.7) 182(-18.5,8.7) 183(-15.42,9.1) 184(-18.5,9.1) 185(-15.42,9.5) 186(-18.5,9.5) 187(-15.42,9.9) 188(-18.5,9.9) 189(-15.42,10.3) 190(-18.5,10.3) 191(-15.42,10.7) 192(-18.5,10.7) 193(-15.42,11.1) 194(-18.5,11.1) 195(-15.42,11.5) 196(-18.5,11.5) 197(-15.42,11.9) 198(-18.5,11.9) 199(-15.42,12.3) 200(-18.5,12.3)
  round 5 hole 2.7: NC(-16.5,-24) NC(-16.5,24) NC(16.5,-24) NC(16.5,24)
via -15.156,-25.344 diameter 0.62 hole 0.3
via -16.5,-25.9 diameter 0.62 hole 0.3
via -15.773,-25.755 diameter 0.62 hole 0.3
via -14.745,-24.727 diameter 0.62 hole 0.3
via -15.157,-22.657 diameter 0.62 hole 0.3
via -14.6,-24 diameter 0.62 hole 0.3
via -14.745,-23.273 diameter 0.62 hole 0.3
via -15.773,-22.245 diameter 0.62 hole 0.3
via -17.843,-25.344 diameter 0.62 hole 0.3
via -18.4,-24 diameter 0.62 hole 0.3
via -18.255,-24.727 diameter 0.62 hole 0.3
via -17.227,-25.755 diameter 0.62 hole 0.3
via -18.255,-23.273 diameter 0.62 hole 0.3
via -17.227,-22.245 diameter 0.62 hole 0.3
via -16.5,-22.1 diameter 0.62 hole 0.3
via -17.844,-22.657 diameter 0.62 hole 0.3
via 17.844,-25.344 diameter 0.62 hole 0.3
via 16.5,-25.9 diameter 0.62 hole 0.3
via 17.227,-25.755 diameter 0.62 hole 0.3
via 18.255,-24.727 diameter 0.62 hole 0.3
via 17.843,-22.657 diameter 0.62 hole 0.3
via 18.4,-24 diameter 0.62 hole 0.3
via 18.255,-23.273 diameter 0.62 hole 0.3
via 17.227,-22.245 diameter 0.62 hole 0.3
via 15.157,-25.344 diameter 0.62 hole 0.3
via 14.6,-24 diameter 0.62 hole 0.3
via 14.745,-24.727 diameter 0.62 hole 0.3
via 15.773,-25.755 diameter 0.62 hole 0.3
via 14.745,-23.273 diameter 0.62 hole 0.3
via 15.773,-22.245 diameter 0.62 hole 0.3
via 16.5,-22.1 diameter 0.62 hole 0.3
via 15.156,-22.657 diameter 0.62 hole 0.3
via 17.844,22.656 diameter 0.62 hole 0.3
via 16.5,22.1 diameter 0.62 hole 0.3
via 17.227,22.245 diameter 0.62 hole 0.3
via 18.255,23.273 diameter 0.62 hole 0.3
via 17.843,25.343 diameter 0.62 hole 0.3
via 18.4,24 diameter 0.62 hole 0.3
via 18.255,24.727 diameter 0.62 hole 0.3
via 17.227,25.755 diameter 0.62 hole 0.3
via 15.157,22.656 diameter 0.62 hole 0.3
via 14.6,24 diameter 0.62 hole 0.3
via 14.745,23.273 diameter 0.62 hole 0.3
via 15.773,22.245 diameter 0.62 hole 0.3
via 14.745,24.727 diameter 0.62 hole 0.3
via 15.773,25.755 diameter 0.62 hole 0.3
via 16.5,25.9 diameter 0.62 hole 0.3
via 15.156,25.344 diameter 0.62 hole 0.3
via -15.156,22.656 diameter 0.62 hole 0.3
via -16.5,22.1 diameter 0.62 hole 0.3
via -15.773,22.245 diameter 0.62 hole 0.3
via -14.745,23.273 diameter 0.62 hole 0.3
via -15.157,25.343 diameter 0.62 hole 0.3
via -14.6,24 diameter 0.62 hole 0.3
via -14.745,24.727 diameter 0.62 hole 0.3
via -15.773,25.755 diameter 0.62 hole 0.3
via -17.843,22.656 diameter 0.62 hole 0.3
via -18.4,24 diameter 0.62 hole 0.3
via -18.255,23.273 diameter 0.62 hole 0.3
via -17.227,22.245 diameter 0.62 hole 0.3
via -18.255,24.727 diameter 0.62 hole 0.3
via -17.227,25.755 diameter 0.62 hole 0.3
via -16.5,25.9 diameter 0.62 hole 0.3
via -17.844,25.344 diameter 0.62 hole 0.3
Top Overlay:
  circle w0.254: c11,25 r0.86
  region: -14.82,-7.3 -14.32,-6.9 -14.32,-7.7
  region: 19.1,-7.3 19.6,-6.9 19.6,-7.7
  lines w0.12: -18.85,-7.9 -18.85,-8.9 -15.07,-8.9 ; -18.85,12.9 -18.85,13.9 -15.07,13.9 ; 15.07,-7.9 15.07,-8.9 18.85,-8.9 ; 18.85,12.9 18.85,13.9 15.07,13.9 ; -15.07,-8.9 -15.07,-7.9 -15.07,-8.9 ; -15.07,13.9 -15.07,12.9 -15.07,13.9 ; 15.07,13.9 15.07,12.9 15.07,13.9 ; 18.85,-8.9 18.85,-7.9 18.85,-8.9
  lines w0.254: -1.5,21 9.5,21 ; -1.5,21 -1.5,27.5 ; -1.5,21 -1.5,27.5 ; -1.5,21 9.5,21 ; -1.5,27.5 -1.5,24 -1.5,27.5 ; 9.5,21 9.5,27.5 9.5,21 ; -20,-24 ccw(c-16.5,-24) -16.5,-27.5 16.5,-27.5 ccw(c16.5,-24) 20,-24 20,24 ccw(c16.5,24) 16.5,27.5 -16.5,27.5 ccw(c-16.5,24) -20,24 -20,-24 ; -12.5,15.1 -9.8,15.1 -9.8,17.2 -12.5,17.2 -12.5,15.1 ; -12.4,23.5 -9.7,23.5 -9.7,25.6 -12.4,25.6 -12.4,23.5 ; -10.8,18.1 -10.8,22.8 -5.7,22.8 -5.7,18.1 -10.8,18.1 ; -10.5,-26.1 -10.5,-13.5 4.2,-13.5 4.2,-26.1 -10.5,-26.1 ; -10.5,-11.8 -10.5,2.9 4.3,2.9 4.3,-11.8 -10.5,-11.8 ; -6.5,23.5 -3.8,23.5 -3.8,25.6 -6.5,25.6 -6.5,23.5 ; -6.4,15 -3.7,15 -3.7,17.1 -6.4,17.1 -6.4,15
3D body "Spacer_1.5mm.x_t": height 1.5, standoff 0, extent -18.9,21.6 -14.1,26.4
3D body "CM4 Heatsink.x_t": height 10.65, standoff 5.65, extent -20,-27.497 20,27.503
3D body "DF40C-100DS.x_t": height 1.4, standoff -0.05, extent 15.31,-8.785 18.69,13.815
3D body "DF40C-100DS.x_t": height 1.4, standoff -0.05, extent -18.69,-8.785 -15.31,13.815
3D body "cm4-rev1-3_new.STEP": height 5.16, standoff 0.38, extent -20,-27.5 20,27.5
3D body "Spacer_1.5mm.x_t": height 1.5, standoff 0, extent 14.1,21.6 18.9,26.4
3D body "Spacer_1.5mm.x_t": height 1.5, standoff 0, extent 14.1,-26.4 18.9,-21.6
3D body "Spacer_1.5mm.x_t": height 1.5, standoff 0, extent -18.9,-26.4 -14.1,-21.6

## SMD Connector (1661) [mm] "SMD_LED_RED"
height 8.65
pads (52):
  rect 2x0.25 smd: 1(2.2,6) 2(2.2,5.5) 3(2.2,5) 4(2.2,4.5) 5(2.2,4) 6(2.2,3.5) 7(2.2,3) 8(2.2,2.5) 9(2.2,2) 10(2.2,1.5) 11(2.2,1) 12(2.2,0.5) 13(2.2,0) 14(2.2,-0.5) 15(2.2,-1) 16(2.2,-1.5) 17(2.2,-2) 18(2.2,-2.5) 19(2.2,-3) 20(2.2,-3.5) 21(2.2,-4) 22(2.2,-4.5) 23(2.2,-5) 24(2.2,-5.5) 25(2.2,-6) 26(-2.2,-6) 27(-2.2,-5.5) 28(-2.2,-5) 29(-2.2,-4.5) 30(-2.2,-4) 31(-2.2,-3.5) 32(-2.2,-3) 33(-2.2,-2.5) 34(-2.2,-2) 35(-2.2,-1.5) 36(-2.2,-1) 37(-2.2,-0.5) 38(-2.2,0) 39(-2.2,0.5) 40(-2.2,1) 41(-2.2,1.5) 42(-2.2,2) 43(-2.2,2.5) 44(-2.2,3) 45(-2.2,3.5) 46(-2.2,4) 47(-2.2,4.5) 48(-2.2,5) 49(-2.2,5.5) 50(-2.2,6)
  round 0 hole 0.55: NC(-1.25,-6.95) NC(-1.25,6.95)
Top Overlay:
  region: 3.5,6 4,5.6 4,6.4
  lines w0.152: -2,-7.6 2,-7.6 2,7.6 -1.4,7.6 -2,7 -2,-7.6

## SMD Crystal 3.2X2.5X0.8 [mm] "SMD_LED_RED"
height 8.65
pads (4):
  rect 1.4x1.2 smd: 1(1.2,0.95) 2(-1.2,-0.95) 3(-1.2,0.95) 3(1.2,-0.95)
Top Overlay:
  circle w0.2: c1.9,1.6 r0.098
  lines w0.254: -1.6,-1.25 1.6,-1.25 1.6,1.25 -1.6,1.25 -1.6,-1.25
3D body "User Library-Crystal TXC Corp 7M series.step": height 0.8, standoff 0, extent -1.65,-1.3 1.65,1.3

## SMD Diode SOD-123 [mm] "SM LED; 2 Flat Leads"
height 1.3
pads (2):
  rect 1x1.2 smd: A(-1.62,0) K(1.62,0)
Top Overlay:
  rectangle: 0.125,-0.875 0.75,0.9
  lines w0.2: -1.4,-0.85 1.4,-0.85 ; -1.4,0.85 1.4,0.85
  lines w0.203: -1.4,-0.85 -1.4,0.85 ; 1.4,-0.85 1.4,0.85
3D body "User Library-SOD-123_DiodesInc.step": height 1.42, standoff -0.03, extent -1.925,-0.85 1.925,0.85

## SMD Diode TO-277 [mm] "SM LED; 2 Flat Leads"
height 1.3
pads (3):
  rect 1.4x1.4 smd: A(-3.805,-1.04) A(-3.805,1.04)
  rect 4.72x4.8 smd: K(0,0)
Top Overlay:
  rectangle: -0.8,-2.025 0.5,2.025
  lines w0.203: -3.925,-2.025 1.325,-2.025 1.325,2.025 -3.925,2.025 -3.925,-2.025
3D body "User Library-TO-277A(SMPC).x_b": height 1.2, standoff 0, extent -4.4,-2.375 2.25,2.375

## SMD Elko 10.0x10.0 [mm]
pads (2):
  rect 5x2.2 smd: M(4.2,0) P(-4.2,0)
Top Overlay:
  lines w0.254: -5.5,-5 -4.5,-5 ; -5,-5.5 -5,-4.5 ; -5,-3.25 -5,3.25 -3.25,5 4.5,5 cw(c4.5,4.5) 5,4.5 5,-4.5 cw(c4.5,-4.5) 4.5,-5 -3.25,-5 -5,-3.25
3D body "User Library-A3D-003-00015.x_b": height 10.3, standoff 0.1, extent -5.85,-5.15 5.85,5.15

## SMD Elko 12.5x13.5 [mm]
pads (2):
  rect 5.5x2.5 smd: M(5.5,0) P(-5.5,0)
Top Overlay:
  lines w0.254: -7.25,-6.5 -5.75,-6.5 ; -6.5,-7.25 -6.5,-5.75 ; -6.75,-4.25 -4.25,-6.75 5.896,-6.75 ccw(c5.896,-5.896) 6.75,-5.896 6.75,5.896 ccw(c5.896,5.896) 5.896,6.75 -4.25,6.75 -6.75,4.25 -6.75,-4.25
3D body "User Library-A3D-003-00018.x_b": height 13.5, standoff 0, extent -7.45,-6.75 7.45,6.75

## SMD HDMI Horizontal [mm]
height 2.54
pads (23):
  rect 0.3x2.6 smd: 1(4.5,0.76) 2(4,0.76) 3(3.5,0.76) 4(3,0.76) 5(2.5,0.76) 6(2,0.76) 7(1.5,0.76) 8(1,0.76) 9(0.5,0.76) 10(0,0.76) 11(-0.5,0.76) 12(-1,0.76) 13(-1.5,0.76) 14(-2,0.76) 15(-2.5,0.76) 16(-3,0.76) 17(-3.5,0.76) 18(-4,0.76) 19(-4.5,0.76)
  oval 1.5x2.7 hole 0.9 slot 2.1 at 90 deg: SHD(-7.25,-5.96) SHD(7.25,-5.96)
  oval 1.5x3.3 hole 0.9 slot 2.7 at 90 deg: SHD(-7.25,0) SHD(7.25,0)
Top Overlay:
  lines w0.254: -7.008,1.6 -7.008,-9.85 7.008,-9.85 7.008,1.6 ; -7.5,-10.6 -7.5,1.6 7.5,1.6 7.5,-10.6 -7.5,-10.6 ; -5.476,-8.445 -5.476,-2.432 -5.44,-2.309 -5.302,-2.251 -5.201,-2.251 -5.049,-2.309 -4.992,-2.432 -4.75,-7.6 ccw(c-4.196,-7.546) -3.643,-7.6 -3.401,-2.432 -3.336,-2.309 -3.199,-2.251 -3.105,-2.251 -2.946,-2.309 -2.888,-2.432 -2.888,-8.445 -2.946,-8.619 -3.047,-8.778 -3.199,-8.901 -3.401,-8.937 -4.992,-8.937 -5.201,-8.901 -5.36,-8.778 -5.461,-8.619 -5.476,-8.445 ; 2.888,-8.445 2.946,-8.619 3.047,-8.778 3.199,-8.901 3.401,-8.937 4.992,-8.937 5.201,-8.901 5.36,-8.778 5.461,-8.619 5.476,-8.445 5.476,-2.432 5.44,-2.309 5.302,-2.251 5.201,-2.251 5.049,-2.309 4.992,-2.432 4.75,-7.6 cw(c4.196,-7.546) 3.643,-7.6 3.401,-2.432 3.336,-2.309 3.199,-2.251 3.105,-2.251 2.946,-2.309 2.888,-2.432 2.888,-8.445
3D body "HDMI.x_t": height 6.18, standoff -2.12, extent -7.5,-10.575 7.5,1.565

## SMD IC MSOP-8 [mm] "Shrink Small Outline; 16 Leads; Body Width 4.4 mm; Pitch 0.65 mm"
height 1.1
pads (8):
  oval 1x0.4 smd: 1(-2.4,0.975) 2(-2.4,0.325) 3(-2.4,-0.325) 4(-2.4,-0.975) 5(2.4,-0.975) 6(2.4,-0.325) 7(2.4,0.325) 8(2.4,0.975)
Top Overlay:
  circle w0.35: c-2,1.75 r0.065
  lines w0.2: -1,-1.5 -1,1.5 ; -1.5,-1.5 -1.5,1.5 -0.35,1.5 ccw(c0,1.5) 0.35,1.5 1.5,1.5 1.5,-1.5 -1.5,-1.5
3D body "User Library-msop-8.x_t": height 1.15, standoff 0, extent -2.45,-1.5 2.45,1.5

## SMD IC MSOP-10 [mm] "Shrink Small Outline; 16 Leads; Body Width 4.4 mm; Pitch 0.65 mm"
height 1.1
pads (10):
  oval 0.3x1 smd: 1(1,2.4) 2(0.5,2.4) 3(0,2.4) 4(-0.5,2.4) 5(-1,2.4) 6(-1,-2.4) 7(-0.5,-2.4) 8(0,-2.4) 9(0.5,-2.4) 10(1,-2.4)
Top Overlay:
  circle w0.35: c1.75,2 r0.065
  lines w0.2: -1.5,1 1.5,1 ; -1.5,-1.5 1.5,-1.5 1.5,-0.35 cw(c1.5,0) 1.5,0.35 1.5,1.5 -1.5,1.5 -1.5,-1.5
3D body "User Library-msop-10.x_t": height 1.15, standoff 0, extent -1.5,-2.45 1.5,2.45

## SMD IC SM-8 [mm] "Shrink Small Outline; 16 Leads; Body Width 4.4 mm; Pitch 0.65 mm"
height 1.1
pads (8):
  oval 1x0.4 smd: 1(-1.75,0.975) 2(-1.75,0.325) 3(-1.75,-0.325) 4(-1.75,-0.975) 5(1.75,-0.975) 6(1.75,-0.325) 7(1.75,0.325) 8(1.75,0.975)
Top Overlay:
  circle w0.35: c-1.8,1.8 r0.065
  lines w0.2: -0.8,-1.5 -0.8,1.5 ; -1.4,-1.5 1.4,-1.5 1.4,1.5 0.35,1.5 cw(c0,1.5) -0.35,1.5 -1.4,1.5 -1.4,-1.5
3D body "SM8.x_t": height 1.1, standoff 0, extent -2,-1.45 2,1.45

## SMD IC SOIC-8 [mm]
height 1.7
pads (8):
  oval 0.6x2.2 smd: 1(1.905,2.7) 2(0.635,2.7) 3(-0.635,2.7) 4(-1.905,2.7) 5(-1.905,-2.7) 6(-0.635,-2.7) 7(0.635,-2.7) 8(1.905,-2.7)
Top Overlay:
  circle w0.406: c1.683,0.9 r0.191
  lines w0.2: -2.517,1.625 2.483,1.625 ; 2.483,-2 -2.517,-2 -2.517,2 2.483,2
  lines w0.203: 2.483,-2 2.483,-0.5 cw(c2.483,0) 2.483,0.5 2.483,2
3D body "User Library-SO-8-1.step": height 1.75, standoff 0, extent -2.517,-3.122 2.483,3.122

## SMD IC SOT-363 (SC-70-6) [mm]
pads (6):
  rect 0.6x0.4 smd: 1(-0.95,0.65) 2(-0.95,0) 3(-0.95,-0.65) 4(0.95,-0.65) 5(0.95,0) 6(0.95,0.65)
Top Overlay:
  circle w0.37: c-0.7,1.3 r0.1
  lines w0.203: -0.625,-1.05 0.625,-1.05 0.625,1.05 -0.25,1.05 -0.625,0.675 -0.625,-1.05
3D body "User Library-SC70-6.step": height 0.92, standoff -0.03, extent -1.05,-1 1.05,1